# Altium footprint library 封装库.PcbLib: 755 footprints (part 25 of 48)
Each footprint in its own frame and in the unit in brackets; x right, y up, seen from the top. Pads: shape width x height; smd on the part's side, far side on the other; paste and mask are expansions set on the pad; w line width, h text height; cw(c..) or ccw(c..) is an arc to the next point about the centre after c.
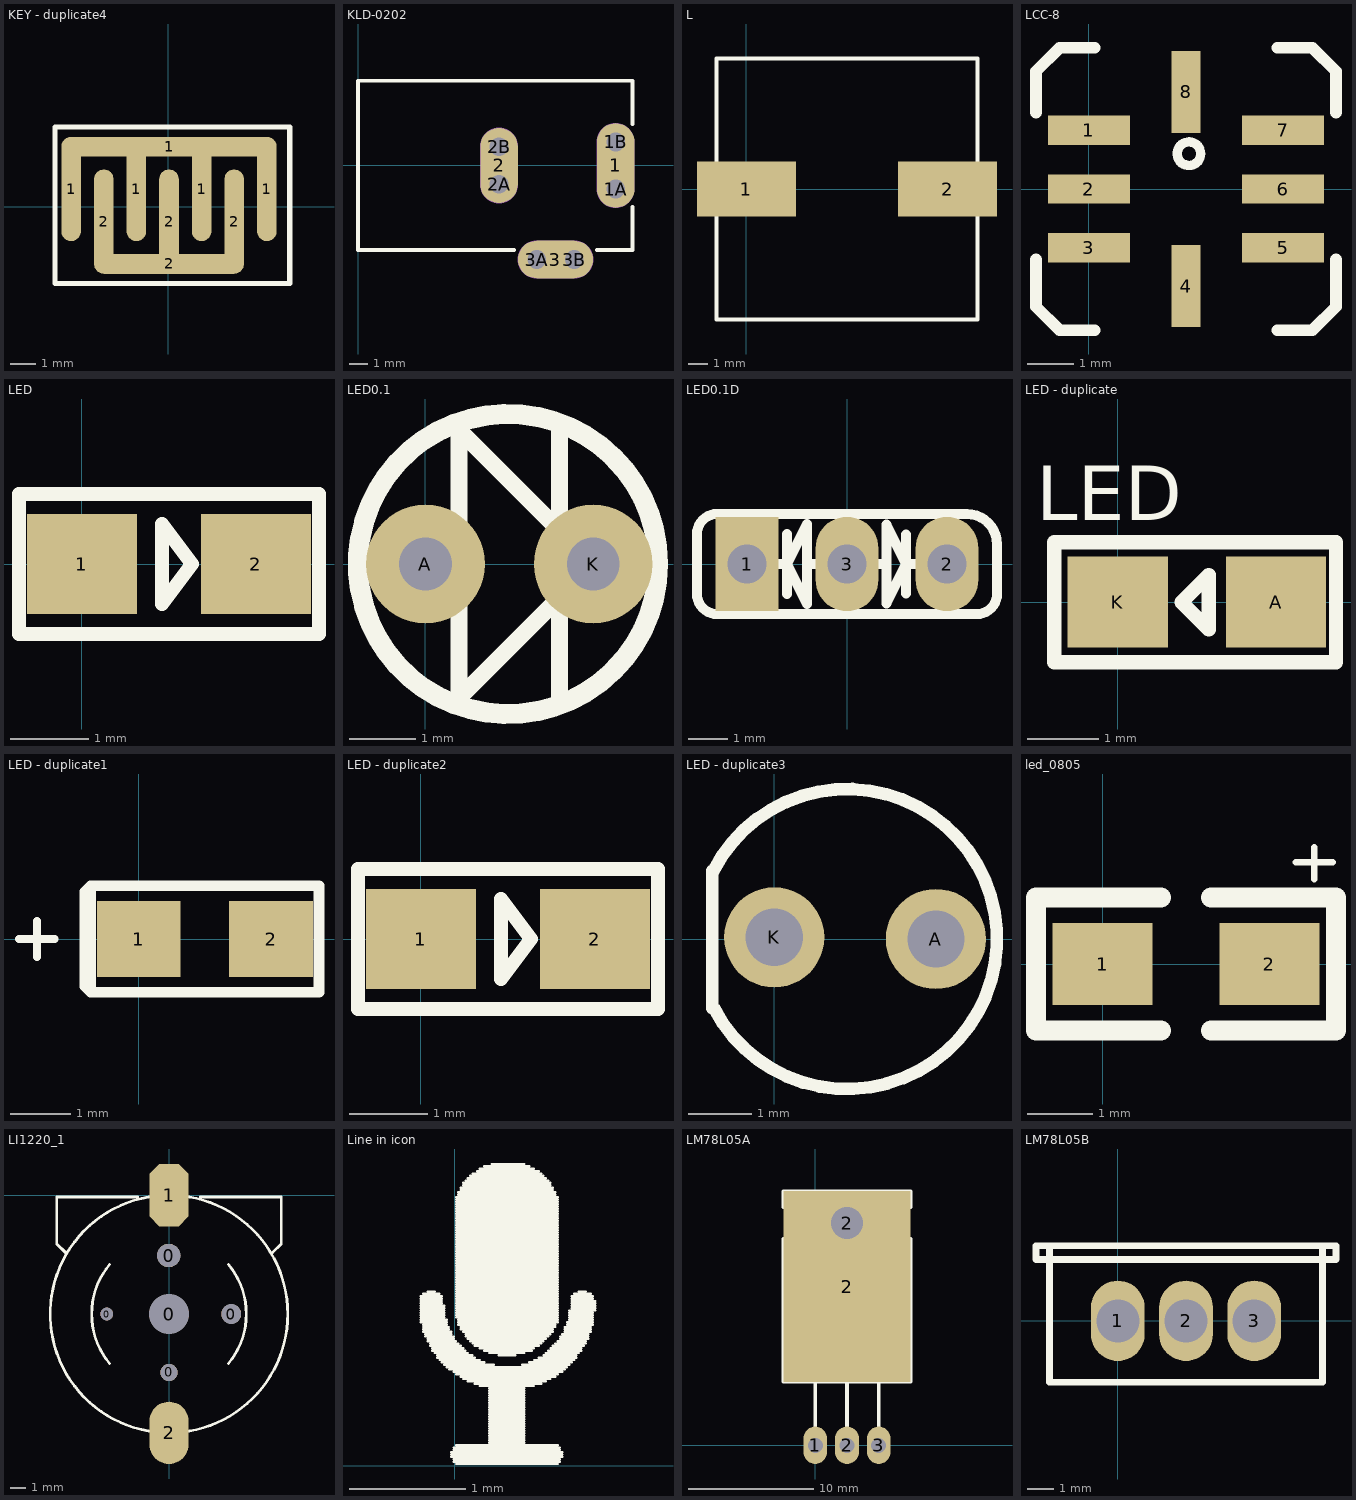
[diagram p24: the footprints below, top view; thin cyan lines are the x and y axes]

## KEY - duplicate4 [mil]
pads (9):
  oval 30x160 smd: 1(-148.82,27.56) 1(-48.82,27.56) 1(51.18,27.56) 1(151.18,27.56) 2(-98.82,-22.44) 2(1.18,-22.44) 2(101.18,-22.44)
  oval 330x30 smd: 1(1.18,92.56)
  oval 230x30 smd: 2(1.18,-87.44)
Top Overlay:
  lines w8: -173.82,-117.44 186.18,-117.44 186.18,122.56 -173.82,122.56 -173.82,-117.44

## KLD-0202 [mm] "DC Power Jack, 2.5mm, KLD Series, PCB Mount"
pads (9):
  oval 2x4.5 all layers, no hole: 1(13.7,0)
  round 1.5 hole 1: 1A(13.7,-1.25) 1B(13.7,1.25) 2A(7.5,-1) 2B(7.5,1) 3A(9.5,-5) 3B(11.5,-5)
  oval 2x4 all layers, no hole: 2(7.5,0)
  oval 4x2 all layers, no hole: 3(10.5,-5)
Top Overlay:
  lines w0.2: 8.3,-4.5 0,-4.5 0,4.5 14.6,4.5 14.6,2.2 ; 12.7,-4.5 14.6,-4.5 14.6,-2.2
Mechanical 1:
  lines w1: 7.5,-1 7.5,1 ; 9.5,-5 11.5,-5 ; 13.7,-1.25 13.7,1.25
  text "Alert PCB fab to slot details" at 0.286,6.066 h0.3
  text "Assign keep-out area to slot" at 0.286,6.566 h0.3
  text "Mech 1 - Slot cut-out" at 0.286,5.566 h0.3
  text "Mech 2 - Clearance, move to internal plane if present" at 0.286,5.066 h0.3
Mechanical 2:
  lines w2.016: 7.5,-1 7.5,1 ; 9.5,-5 11.5,-5 ; 13.7,-1.25 13.7,1.25

## L [mm]
pads (2):
  rect 5x2.8 smd: 1(0,0) 2(10.16,0)
Top Overlay:
  lines w0.203: -1.524,-6.604 11.684,-6.604 11.684,6.604 -1.524,6.604 -1.524,0 -1.524,-6.604

## LCC-8 [mil]
pads (8):
  rect 70x25 smd: 1(0,50) 2(0,0) 3(0,-50) 5(165,-50) 6(165,0) 7(165,50)
  rect 25x70 smd: 4(82.5,-82.5) 8(82.5,82.5)
Top Overlay:
  circle w8: c85,30 r10
  lines w10: -45,-60 -45,-100 -25,-120 5,-120 ; -45,65 -45,100 -25,120 5,120 ; 160,-120 190,-120 210,-100 210,-60 ; 160,120 190,120 210,100 210,65

## LED [mm]
pads (2):
  rect 1.4x1.27 smd: 1(0,0) 2(2.21,0)
Top Overlay:
  lines w0.178: 3.011,0.889 3.01,0.889 ; 3.01,0.889 -0.8,0.889 -0.8,0 -0.8,-0.889 3.01,-0.889 3.01,0.889 ; 1.016,-0.508 1.397,0 1.016,0.508 1.016,-0.508

## LED0.1 [mm]
pads (2):
  round 1.8 hole 0.8: A(0,0) K(2.54,0)
Top Overlay:
  circle w0.305: c1.25,0 r2.272
  lines w0.254: 2.032,-2.032 2.032,2.032 ; 2.032,-0.508 0.508,-2.032 0.508,2.032 2.032,0.508

## LED0.1D [mm]
pads (3):
  rect 1.6x2.4 hole 1: 1(-2.54,0)
  oval 1.6x2.4 hole 1: 2(2.54,0) 3(0,0)
Top Overlay:
  lines w0.254: -2.032,0 -1.524,0 ; -1.524,-0.762 -1.524,0.762 ; -1.016,0 -0.508,0 ; 0.762,0 1,0 ; 1.496,-0.754 1.496,0.746 ; 2.032,0 1.5,0 ; -1.524,0 -1.016,-1.016 -1.016,1.016 -1.524,0 ; 1,1 1,-1 1.5,0 ; 1,1 1.5,0 ; 1,1 1.5,0 ; -3.81,-0.762 ccw(c-3.302,-0.762) -3.302,-1.27 3.302,-1.27 ccw(c3.302,-0.762) 3.81,-0.762 3.81,0.508 ccw(c3.048,0.508) 3.048,1.27 -3.302,1.27 ccw(c-3.302,0.762) -3.81,0.762 -3.81,-0.762

## LED - duplicate [mm]
pads (2):
  rect 1.4x1.27 smd: A(2.21,0) K(0,0)
Top Overlay:
  lines w0.2: -0.889,-0.838 -0.889,0.838 0.095,0.838 2.064,0.838 3.048,0.838 3.048,-0.838 -0.889,-0.838 ; 0.889,0 1.27,0.381 1.27,-0.381 0.889,0
  text "LED" at -1.143,1.143 h0.76

## LED - duplicate1 [mm]
pads (2):
  rect 1.4x1.27 smd: 1(0,0) 2(2.21,0)
Top Overlay:
  lines w0.127: -2,0 -1.5,0 -1.4,0 ; -1.7,-0.3 -1.7,0.3
  lines w0.178: -0.901,-0.788 -0.901,0.788 -0.8,0.889 ; -0.901,-0.788 -0.8,-0.889 ; -0.901,-0.788 -0.8,-0.889 ; -0.8,-0.889 3.01,-0.889 3.01,0.889 -0.8,0.889 ; -0.8,-0.889 -0.8,0 -0.8,0.889

## LED - duplicate2 [mm]
pads (2):
  rect 1.4x1.27 smd: 1(0,0) 2(2.21,0)
Top Overlay:
  lines w0.178: 3.011,0.889 3.01,0.889 ; 3.01,0.889 -0.8,0.889 -0.8,0 -0.8,-0.889 3.01,-0.889 3.01,0.889 ; 1.016,-0.508 1.397,0 1.016,0.508 1.016,-0.508

## LED - duplicate3 [mil]
pads (2):
  round 62 hole 35.43: A(100,0) K(0,1)
Top Overlay:
  lines w7.87: -38.34,-42.75 -38.34,42.08 ; -37.62,42.22 cw(c45,0) -37.34,-42.75

## led_0805 [mm]
pads (2):
  rect 1.524x1.25 smd: 1(0,0) 2(2.54,0)
Top Overlay:
  lines w0.1: 2.946,1.549 3.505,1.549 ; 3.226,1.295 3.226,1.778
  lines w0.305: 0.889,-1.016 -1.016,-1.016 -1.016,1.016 0.889,1.016 ; 1.651,-1.016 3.556,-1.016 3.556,1.016 1.651,1.016

## LI1220_1 [mm]
pads (7):
  round 0.813 hole 0.813: 0(-3.995,-7.604)
  round 1.5 hole 1.5: 0(-0.032,-3.854)
  round 1.1 hole 1.1: 0(-0.007,-11.354)
  round 2.54 hole 2.54: 0(-0.007,-7.604)
  round 1.27 hole 1.27: 0(3.981,-7.604)
  oct 2.5x4 smd: 1(-0.007,0.016)
  oval 2.5x4 smd: 2(-0.007,-15.224)
Top Overlay:
  lines w0.178: -6.632,-3.679 -7.207,-3.104 -7.207,-0.104 -2.007,-0.104 ; -3.82,-10.776 cw(c-0.007,-7.604) -3.817,-4.429 ; -0.84,-15.178 cw(c-0.007,-7.604) -0.84,-0.03 ; 0.826,-15.178 ccw(c-0.007,-7.604) 7.613,-7.604 ccw(c-0.007,-7.604) 0.826,-0.03 ; 1.993,-0.104 7.193,-0.104 7.193,-3.104 6.593,-3.704 ; 3.805,-10.776 ccw(c-0.007,-7.604) 3.808,-4.435

## Line in icon [mm]
Top Overlay:
  drawing of 188 lines, arcs and shapes, not listed

## LM78L05A [mm]
pads (5):
  oval 1.9x3 hole 1.2: 1(0,0) 2(2.54,0) 3(5.08,0)
  rect 10.2x15.3 smd: 2(2.54,12.7)
  round 3 hole 2.54: 2(2.54,17.78)
Top Overlay:
  lines w0.305: 0,1.524 0,5.08 ; 2.54,1.524 2.54,5.08 ; 5.08,1.524 5.08,5.08 ; -2.54,5.08 -2.54,16.51 -1.27,16.51 -1.27,19.05 -2.54,19.05 -2.54,20.32 7.62,20.32 7.62,19.05 6.35,19.05 6.35,16.51 7.62,16.51 7.62,5.08 -2.54,5.08

## LM78L05B [mm]
pads (3):
  oval 2x3 hole 1.6: 1(0,0) 2(2.54,0) 3(5.08,0)
Top Overlay:
  lines w0.254: -2.54,2.794 -3.048,2.794 -3.048,2.286 -2.54,2.286 7.62,2.286 8.128,2.286 8.128,2.794 7.62,2.794 ; -2.54,2.794 -2.54,-2.286 7.62,-2.286 7.62,2.794 ; -2.54,2.794 7.62,2.794